# Altium footprint library THD Miscellaneous Components.PcbLib: 30 footprints (part 2 of 2)
Each footprint in its own frame and in the unit in brackets; x right, y up, seen from the top. Pads: shape width x height; smd on the part's side, far side on the other; paste and mask are expansions set on the pad; w line width, h text height; cw(c..) or ccw(c..) is an arc to the next point about the centre after c.
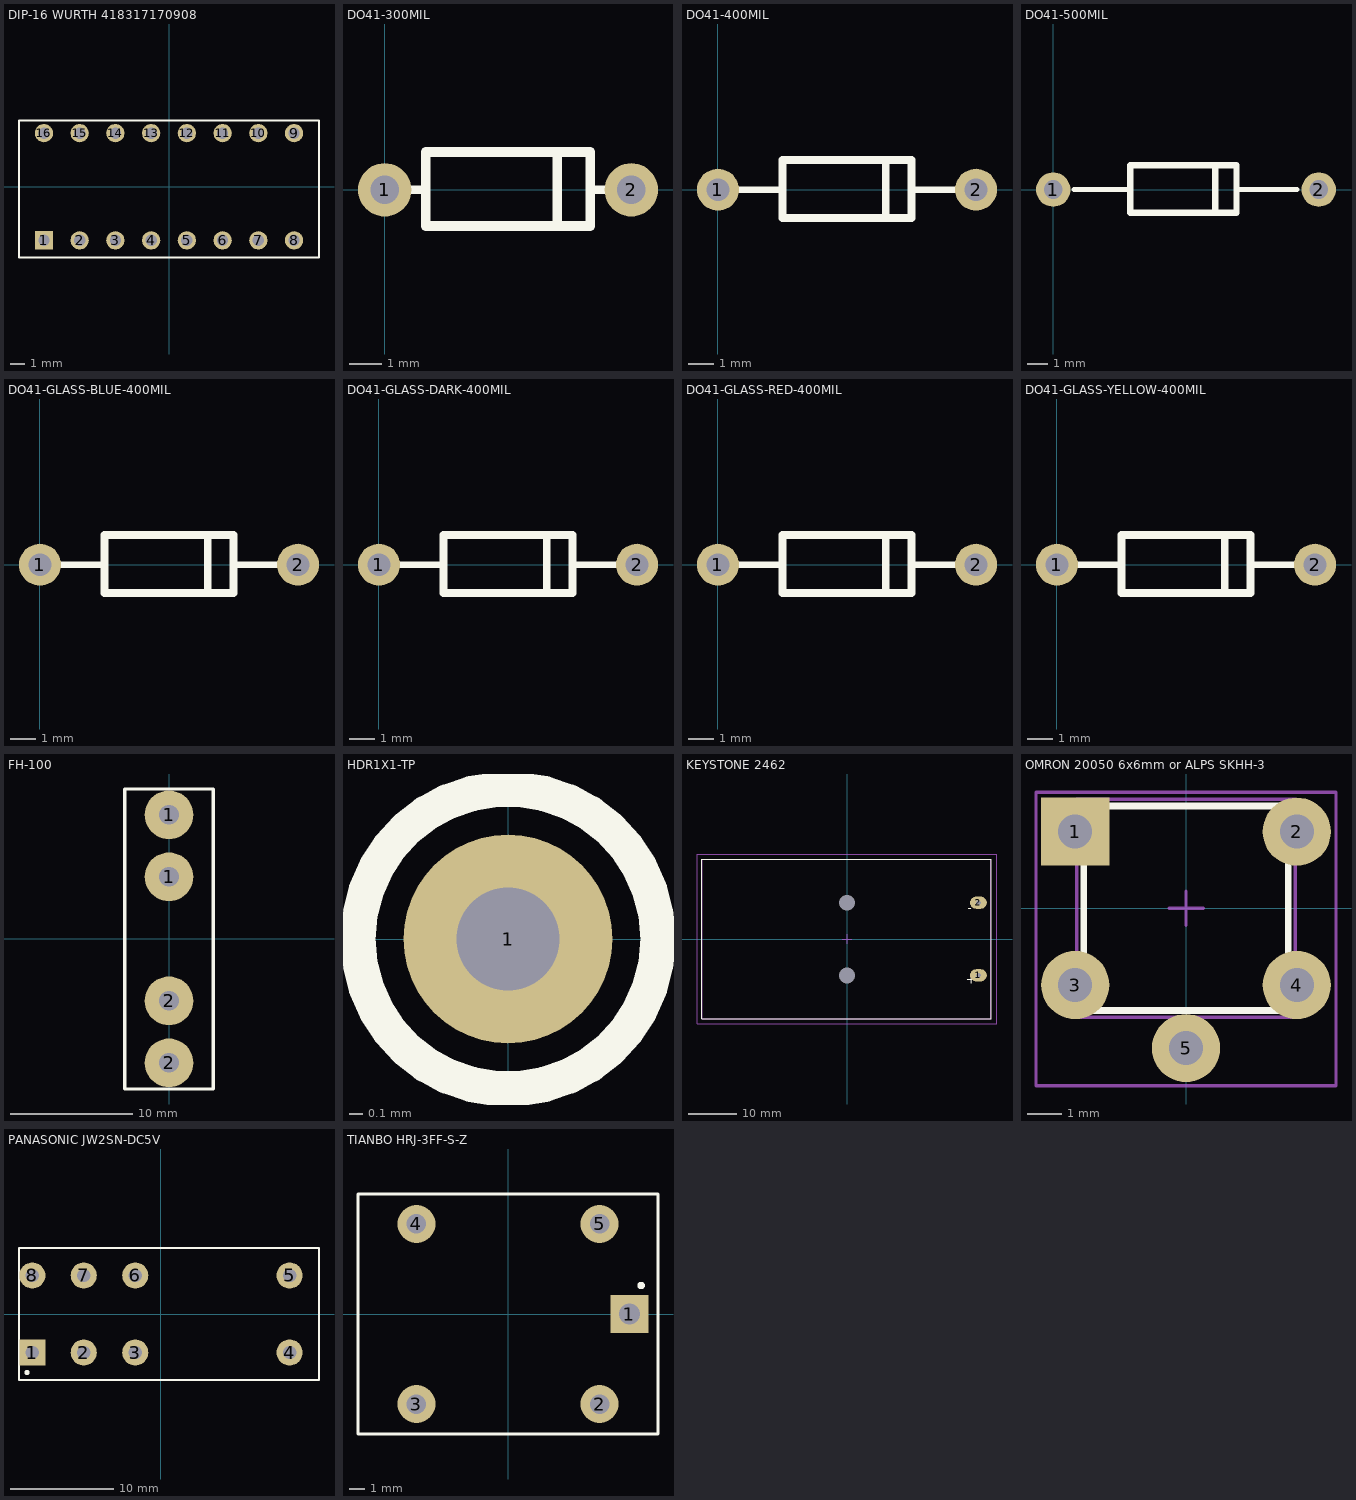
[diagram p1: the footprints below, top view; thin cyan lines are the x and y axes]

## DIP-16 WURTH 418317170908 [mm] "08p, 2.54mm Pitch, Piano, Box Type, THT, flat Actuator, black, without Tape, Tube"
height 6.5
pads (16):
  rect 1.3x1.3 hole 0.8: 1(-8.89,-3.81)
  round 1.3 hole 0.8: 2(-6.35,-3.81) 3(-3.81,-3.81) 4(-1.27,-3.81) 5(1.27,-3.81) 6(3.81,-3.81) 7(6.35,-3.81) 8(8.89,-3.81) 9(8.89,3.81) 10(6.35,3.81) 11(3.81,3.81) 12(1.27,3.81) 13(-1.27,3.81) 14(-3.81,3.81) 15(-6.35,3.81) 16(-8.89,3.81)
Top Overlay:
  lines w0.127: -10.66,-5.02 -10.66,4.7 ; -10.66,-5.02 10.66,-5.02 ; -10.66,-5.02 -10.66,4.7 ; -10.66,-5.02 10.66,-5.02 ; -10.66,4.7 10.66,4.7 ; -10.66,4.7 10.66,4.7 ; 10.66,-5.02 10.66,4.7 ; 10.66,-5.02 10.66,4.7
3D body "418317170908.stp": height 6.5, standoff -3.85, extent -10.66,-5.02 10.66,4.7

## DO41-300MIL [mil]
pads (2):
  round 65 hole 35: 1(0,0) 2(300,0)
Top Overlay:
  lines w10: 0,0 50,0 ; 250,0 300,0
  lines w12: 210,-44 210,46 ; 50,-44 50,46 250,46 250,-44 50,-44
3D body "DO41-300mil.STEP": height 99.61, standoff -78.74, extent -13.78,-47.28 313.78,47.29

## DO41-400MIL [mil]
pads (2):
  round 65 hole 35: 1(0,0) 2(400,0)
Top Overlay:
  lines w10: 0,0 100,0 ; 300,0 400,0
  lines w12: 260,-44 260,46 ; 100,-44 300,-44 300,46 100,46 100,-44
3D body "DO41-400mil.STEP": height 99.61, standoff -78.74, extent -13.78,-47.29 413.78,47.28

## DO41-500MIL [mil]
pads (2):
  round 65 hole 35: 1(0,0) 2(500,0)
Top Overlay:
  lines w10: 39,0 145,0 ; 345,0 459,0
  lines w12: 305,-44 305,46 ; 145,-44 145,46 345,46 345,-44 145,-44
3D body "DO41-500mil.STEP": height 99.61, standoff -78.74, extent -13.78,-47.28 513.78,47.28

## DO41-GLASS-BLUE-400MIL [mil]
pads (2):
  round 65 hole 35: 1(0,0) 2(400,0)
Top Overlay:
  lines w10: 0,0 100,0 ; 300,0 400,0
  lines w12: 260,-44 260,46 ; 100,-44 100,46 300,46 300,-44 100,-44
3D body "DO41-Glass-Blue-400mil.STEP": height 99.25, standoff -78.74, extent -15.35,-47.28 415.36,47.28

## DO41-GLASS-DARK-400MIL [mil]
pads (2):
  round 65 hole 35: 1(0,0) 2(400,0)
Top Overlay:
  lines w10: 0,0 100,0 ; 300,0 400,0
  lines w12: 260,-44 260,46 ; 100,-44 100,46 300,46 300,-44 100,-44
3D body "DO41-Glass-Dark-400mil.STEP": height 99.25, standoff -78.74, extent -15.35,-47.28 415.35,47.28

## DO41-GLASS-RED-400MIL [mil]
pads (2):
  round 65 hole 35: 1(0,0) 2(400,0)
Top Overlay:
  lines w10: 0,0 100,0 ; 300,0 400,0
  lines w12: 260,-44 260,46 ; 100,-44 100,46 300,46 300,-44 100,-44
3D body "DO41-Glass-Red-400mil.STEP": height 99.25, standoff -78.74, extent -15.36,-47.29 415.35,47.28

## DO41-GLASS-YELLOW-400MIL [mil]
pads (2):
  round 65 hole 35: 1(0,0) 2(400,0)
Top Overlay:
  lines w10: 0,0 100,0 ; 300,0 400,0
  lines w12: 260,-44 260,46 ; 100,-44 100,46 300,46 300,-44 100,-44
3D body "DO41-Glass-Yellow-40mil.STEP": height 99.25, standoff -78.74, extent -15.35,-45 415.35,49.57

## FH-100 [mil]
height 27.56
pads (4):
  round 157 hole 62.99: 1(0,200) 1(0,400) 2(0,-400) 2(0,-200)
Top Overlay:
  lines w10: -142.72,-484.25 -142.72,483.27 142.72,483.27 142.72,-484.25 -142.72,-484.25
3D body "FH-100 with fuse 5x20.STEP": height 393.29, standoff -137.8, extent -137.79,-409.44 137.8,409.46

## HDR1X1-TP [mm] "Connector; Header; 2 Position"
pads (1):
  round 1.5 hole 0.737: 1(0,0)
Top Overlay:
  circle w0.254: c0,0 r1.078
3D body "Test Point Single Pin.STEP": height 6.5, standoff -3, extent -0.508,-0.492 0.492,0.508

## KEYSTONE 2462 [mm]
height 16
pads (4):
  oval 3.5x2.5 hole 1.02 unplated: 1(27.165,-7.495) 2(27.165,7.495)
  rect 0x0 hole 3.3 unplated: M(-0.015,-7.495) M(-0.015,7.495)
Top Overlay:
  lines w0.2: -30,-16.5 29.8,-16.5 29.8,16.5 -30,16.5 -30,-16.5
  text "-" at 25,5 h3
  text "+" at 24.5,-10 h3.5
Mechanical 1:
  lines w0.2: -29.959,-16.459 -29.959,16.459 29.755,16.459 29.755,-16.459 -29.959,-16.459
Mechanical 15:
  lines w0.2: -1,0 1,0 ; 0,-1 0,1 ; -31,-17.5 31,-17.5 31,17.5 -31,17.5 -31,-17.5
3D body "Keystone 2462 Twin AA.STEP": height 16, standoff -11.99, extent -29.959,-16.459 29.755,16.459

## OMRON 20050 6x6mm or ALPS SKHH-3 [mm]
height 4.3
pads (5):
  rect 2x2 hole 1: 1(-3.25,2.25)
  round 2 hole 1: 2(3.25,2.25) 3(-3.25,-2.25) 4(3.25,-2.25) 5(0,-4.1)
Top Overlay:
  lines w0.2: -3,-3 3,-3 3,3 -3,3 -3,-3
Mechanical 13:
  lines w0.1: -3.2,-3.2 -3.2,3.2 3.2,3.2 3.2,-3.2 -3.2,-3.2
Mechanical 15:
  lines w0.1: -0.5,0 0.5,0 ; 0,-0.5 0,0.5 ; -4.4,-5.2 -4.4,3.4 4.4,3.4 4.4,-5.2 -4.4,-5.2 ; -4.4,-5.1 -4.4,-5.1
3D body "OMRON 20050.stp": height 6.28, standoff -1.52, extent -3.85,-4.225 3.85,3

## PANASONIC JW2SN-DC5V [mil] "Dual-Pole Dual-Throw Relay; 8 Leads"
pads (8):
  rect 100x100 hole 51: 1(-492.5,-147.5)
  round 100 hole 51: 2(-295.5,-147.5) 3(-98.5,-147.5) 4(492.5,-147.5) 5(492.5,147.5) 6(-98.5,147.5) 7(-295.5,147.5) 8(-492.5,147.5)
Top Overlay:
  circle w9.84: c-512.8,-224.41 r4.92
  lines w7.87: -543.5,-252 605,-252 605,252 -543.5,252 -543.5,-252
3D body "Panasonic JW2SV-DC5V.STEP": height 774.01, standoff -101.69, extent -529,-254.01 599,250

## TIANBO HRJ-3FF-S-Z [mm] "Dual-Pole Singlel-Throw Relay; 5 Leads"
pads (5):
  rect 2.54x2.54 hole 1.4: 1(8.1,0)
  round 2.54 hole 1.3: 2(6.1,-6) 3(-6.1,-6) 4(-6.1,6) 5(6.1,6)
Top Overlay:
  circle w0.25: c8.875,1.9 r0.125
  lines w0.2: -10,-8 10,-8 10,8 -10,8 -10,-8
3D body "TIANBO HJR-3FF-S-Z.STEP": height 15.51, standoff -2.2, extent -9.627,-7.747 9.373,7.753